# Altium footprint library Generic Footprint.PcbLib: 160 footprints (part 15 of 20) (continued)
## Symbol_FCC-Logo-3x2mm_Silkscreen [mm] (continued)
1(1.321,1.222) 1(1.321,1.243) 1(1.321,1.246) 1(1.321,1.249) 1(1.321,1.256) 1(1.321,1.26) 1(1.321,1.763) 1(1.321,1.766) 1(1.321,1.77) 1(1.324,0.331) 1(1.324,0.338) 1(1.324,0.342) 1(1.324,0.838) 1(1.324,0.865) 1(1.324,0.869) 1(1.324,0.872) 1(1.324,0.875) 1(1.324,1.226) 1(1.324,1.229) 1(1.324,1.232) 1(1.324,1.236) 1(1.324,1.239) 1(1.324,1.243) 1(1.324,1.253) 1(1.324,1.263) 1(1.324,1.266) 1(1.324,1.759) 1(1.324,1.766) 1(1.328,0.328) 1(1.328,0.335) 1(1.328,0.338) 1(1.328,0.824) 1(1.328,0.828) 1(1.328,0.831) 1(1.328,0.835) 1(1.328,0.838) 1(1.328,0.841) 1(1.328,0.845) 1(1.328,0.848) 1(1.328,0.852) 1(1.328,0.855) 1(1.328,0.858) 1(1.328,0.862) 1(1.328,1.246) 1(1.328,1.249) 1(1.328,1.253) 1(1.328,1.256) 1(1.328,1.26) 1(1.328,1.263) 1(1.328,1.27) 1(1.328,1.273) 1(1.328,1.277) 1(1.328,1.763) 1(1.328,1.766) 1(1.328,1.77) 1(1.328,1.773) 1(1.331,0.331) 1(1.331,0.335) 1(1.331,0.818) 1(1.331,0.821) 1(1.331,0.828) 1(1.331,0.831) 1(1.331,0.835) 1(1.331,0.841) 1(1.331,0.845) 1(1.331,0.848) 1(1.331,1.253) 1(1.331,1.256) 1(1.331,1.26) 1(1.331,1.263) 1(1.331,1.27) 1(1.331,1.273) 1(1.331,1.28) 1(1.331,1.283) 1(1.331,1.287) 1(1.331,1.77) 1(1.331,1.773) 1(1.331,1.776) 1(1.334,0.325) 1(1.334,0.328) 1(1.334,0.331) 1(1.334,0.807) 1(1.334,0.811) 1(1.334,0.818) 1(1.334,0.821) 1(1.334,0.828) 1(1.334,0.831) 1(1.334,0.835) 1(1.334,1.27) 1(1.334,1.273) 1(1.334,1.28) 1(1.334,1.283) 1(1.334,1.287) 1(1.334,1.29) 1(1.334,1.294) 1(1.334,1.297) 1(1.334,1.3) 1(1.334,1.773) 1(1.334,1.78) 1(1.338,0.318) 1(1.338,0.321) 1(1.338,0.325) 1(1.338,0.328) 1(1.338,0.807) 1(1.338,0.811) 1(1.338,0.814) 1(1.338,0.818) 1(1.338,0.821) 1(1.338,1.28) 1(1.338,1.283) 1(1.338,1.287) 1(1.338,1.294) 1(1.338,1.297) 1(1.338,1.3) 1(1.338,1.783) 1(1.341,0.314) 1(1.341,0.325) 1(1.341,0.804) 1(1.341,0.807) 1(1.341,1.297) 1(1.341,1.787) 1(1.345,0.311) 1(1.345,0.318) 1(1.345,0.78) 1(1.345,0.811) 1(1.345,1.294) 1(1.345,1.3) 1(1.345,1.324) 1(1.345,1.79) 1(1.348,0.314) 1(1.348,0.318) 1(1.348,0.767) 1(1.348,0.77) 1(1.348,0.773) 1(1.348,0.78) 1(1.348,0.79) 1(1.348,0.794) 1(1.348,0.797) 1(1.348,0.801) 1(1.348,1.304) 1(1.348,1.307) 1(1.348,1.311) 1(1.348,1.324) 1(1.348,1.331) 1(1.348,1.334) 1(1.348,1.338) 1(1.348,1.79) 1(1.348,1.793) 1(1.351,0.308) 1(1.351,0.311) 1(1.351,0.314) 1(1.351,0.76) 1(1.351,0.767) 1(1.351,0.77) 1(1.351,0.773) 1(1.351,0.78) 1(1.351,0.784) 1(1.351,0.787) 1(1.351,1.314) 1(1.351,1.317) 1(1.351,1.321) 1(1.351,1.324) 1(1.351,1.331) 1(1.351,1.334) 1(1.351,1.338) 1(1.351,1.341) 1(1.351,1.345) 1(1.351,1.79) 1(1.351,1.793) 1(1.351,1.797) 1(1.355,0.301) 1(1.355,0.304) 1(1.355,0.308) 1(1.355,0.311) 1(1.355,0.75) 1(1.355,0.753) 1(1.355,0.756) 1(1.355,0.76) 1(1.355,0.767) 1(1.355,0.773) 1(1.355,0.777) 1(1.355,1.328) 1(1.355,1.331) 1(1.355,1.338) 1(1.355,1.341) 1(1.355,1.345) 1(1.355,1.348) 1(1.355,1.351) 1(1.355,1.793) 1(1.355,1.797) 1(1.355,1.8) 1(1.355,1.804) 1(1.358,0.304) 1(1.358,0.76) 1(1.358,0.763) 1(1.358,0.77) 1(1.358,1.334) 1(1.358,1.341) 1(1.358,1.355) 1(1.358,1.797) 1(1.362,0.301) 1(1.362,0.304) 1(1.362,0.308) 1(1.362,0.739) 1(1.362,0.743) 1(1.362,0.746) 1(1.362,0.753) 1(1.362,1.345) 1(1.362,1.351) 1(1.362,1.358) 1(1.362,1.362) 1(1.362,1.365) 1(1.362,1.807) 1(1.365,0.297) 1(1.365,0.736) 1(1.365,0.743) 1(1.365,0.753) 1(1.365,1.351) 1(1.365,1.362) 1(1.365,1.365) 1(1.365,1.368) 1(1.365,1.372) 1(1.365,1.81) 1(1.368,0.294) 1(1.368,0.297) 1(1.368,0.301) 1(1.368,0.729) 1(1.368,0.736) 1(1.368,0.743) 1(1.368,1.362) 1(1.368,1.365) 1(1.368,1.368) 1(1.368,1.372) 1(1.368,1.375) 1(1.372,0.291) 1(1.372,0.294) 1(1.372,0.297) 1(1.372,0.729) 1(1.372,0.733) 1(1.372,0.736) 1(1.372,1.368) 1(1.372,1.372) 1(1.372,1.375) 1(1.372,1.814) 1(1.375,0.287) 1(1.375,0.291) 1(1.375,0.294) 1(1.375,0.712) 1(1.375,0.722) 1(1.375,0.726) 1(1.375,0.729) 1(1.375,1.375) 1(1.375,1.392) 1(1.375,1.817) 1(1.379,0.28) 1(1.379,0.284) 1(1.379,0.287) 1(1.379,0.712) 1(1.379,1.379) 1(1.379,1.382) 1(1.379,1.392) 1(1.379,1.399) 1(1.379,1.402) 1(1.379,1.814) 1(1.379,1.817) 1(1.379,1.821) 1(1.382,0.277) 1(1.382,0.284) 1(1.382,0.287) 1(1.382,0.291) 1(1.382,0.699) 1(1.382,0.702) 1(1.382,0.712) 1(1.382,0.716) 1(1.382,0.719) 1(1.382,1.385) 1(1.382,1.389) 1(1.382,1.392) 1(1.382,1.399) 1(1.382,1.406) 1(1.382,1.409) 1(1.382,1.814) 1(1.382,1.817) 1(1.382,1.821) 1(1.382,1.824) 1(1.385,0.28) 1(1.385,0.284) 1(1.385,0.692) 1(1.385,0.695) 1(1.385,0.699) 1(1.385,0.702) 1(1.385,0.705) 1(1.385,0.709) 1(1.385,1.396) 1(1.385,1.399) 1(1.385,1.402) 1(1.385,1.406) 1(1.385,1.409) 1(1.385,1.413) 1(1.385,1.821) 1(1.385,1.824) 1(1.385,1.827) 1(1.389,0.274) 1(1.389,0.277) 1(1.389,0.28) 1(1.389,0.682) 1(1.389,0.685) 1(1.389,0.688) 1(1.389,0.692) 1(1.389,0.695) 1(1.389,0.699) 1(1.389,1.402) 1(1.389,1.406) 1(1.389,1.409) 1(1.389,1.413) 1(1.389,1.416) 1(1.389,1.419) 1(1.389,1.824) 1(1.389,1.831) 1(1.392,0.695) 1(1.392,0.702) 1(1.392,1.413) 1(1.392,1.416) 1(1.392,1.423) 1(1.392,1.827) 1(1.392,1.834) 1(1.396,0.27) 1(1.396,0.277) 1(1.396,0.675) 1(1.396,0.678) 1(1.396,0.685) 1(1.396,0.692) 1(1.396,1.416) 1(1.396,1.419) 1(1.396,1.426) 1(1.396,1.43) 1(1.396,1.827) 1(1.396,1.838) 1(1.399,0.267) 1(1.399,0.27) 1(1.399,0.274) 1(1.399,0.675) 1(1.399,0.685) 1(1.399,1.419) 1(1.399,1.426) 1(1.399,1.43) 1(1.399,1.433) 1(1.399,1.436) 1(1.402,0.263) 1(1.402,0.267) 1(1.402,0.274) 1(1.402,0.665) 1(1.402,0.675) 1(1.402,1.426) 1(1.402,1.43) 1(1.402,1.433) 1(1.402,1.436) 1(1.402,1.841) 1(1.406,0.26) 1(1.406,0.263) 1(1.406,0.267) 1(1.406,0.27) 1(1.406,0.665) 1(1.406,0.671) 1(1.406,1.433) 1(1.406,1.436) 1(1.406,1.841) 1(1.406,1.844) 1(1.409,0.257) 1(1.409,0.26) 1(1.409,0.651) 1(1.409,0.654) 1(1.409,0.668) 1(1.409,1.844) 1(1.409,1.848) 1(1.413,0.253) 1(1.413,0.263) 1(1.413,0.648) 1(1.413,0.654) 1(1.413,0.661) 1(1.413,0.665) 1(1.413,1.44) 1(1.413,1.443) 1(1.413,1.45) 1(1.413,1.453) 1(1.413,1.457) 1(1.413,1.841) 1(1.416,0.26) 1(1.416,0.641) 1(1.416,0.644) 1(1.416,0.648) 1(1.416,0.651) 1(1.416,0.654) 1(1.416,0.658) 1(1.416,1.447) 1(1.416,1.453) 1(1.416,1.457) 1(1.416,1.46) 1(1.416,1.464) 1(1.416,1.467) 1(1.419,0.246) 1(1.419,0.25) 1(1.419,0.253) 1(1.419,0.257) 1(1.419,0.634) 1(1.419,0.637) 1(1.419,0.641) 1(1.419,0.648) 1(1.419,0.651) 1(1.419,1.453) 1(1.419,1.457) 1(1.419,1.46) 1(1.419,1.464) 1(1.419,1.47) 1(1.419,1.844) 1(1.419,1.848) 1(1.419,1.855) 1(1.423,0.25) 1(1.423,0.253) 1(1.423,0.257) 1(1.423,0.631) 1(1.423,0.637) 1(1.423,0.641) 1(1.423,1.46) 1(1.423,1.464) 1(1.423,1.47) 1(1.423,1.474) 1(1.423,1.848) 1(1.423,1.851) 1(1.423,1.855) 1(1.423,1.858) 1(1.426,0.243) 1(1.426,0.246) 1(1.426,1.858) 1(1.426,1.861) 1(1.43,0.25) 1(1.43,0.631) 1(1.43,0.637) 1(1.43,1.47) 1(1.43,1.474) 1(1.43,1.855) 1(1.43,1.865) 1(1.433,0.24) 1(1.433,0.246) 1(1.433,0.631) 1(1.433,1.005) 1(1.433,1.008) 1(1.433,1.011) 1(1.433,1.015) 1(1.433,1.018) 1(1.433,1.022) 1(1.433,1.025) 1(1.433,1.028) 1(1.433,1.032) 1(1.433,1.035) 1(1.433,1.039) 1(1.433,1.042) 1(1.433,1.045) 1(1.433,1.049) 1(1.433,1.052) 1(1.433,1.056) 1(1.433,1.059) 1(1.433,1.062) 1(1.433,1.066) 1(1.433,1.069) 1(1.433,1.073) 1(1.433,1.076) 1(1.433,1.079) 1(1.433,1.083) 1(1.433,1.086) 1(1.433,1.09) 1(1.433,1.093) 1(1.433,1.096) 1(1.433,1.1) 1(1.433,1.474) 1(1.433,1.477) 1(1.433,1.481) 1(1.433,1.487) 1(1.433,1.858) 1(1.433,1.861) 1(1.436,0.236) 1(1.436,0.24) 1(1.436,0.243) 1(1.436,0.614) 1(1.436,0.62) 1(1.436,0.624) 1(1.436,0.627) 1(1.436,0.971) 1(1.436,0.974) 1(1.436,0.977) 1(1.436,0.981) 1(1.436,0.984) 1(1.436,0.988) 1(1.436,0.991) 1(1.436,0.994) 1(1.436,1.005) 1(1.436,1.008) 1(1.436,1.011) 1(1.436,1.015) 1(1.436,1.018) 1(1.436,1.022) 1(1.436,1.025) 1(1.436,1.028) 1(1.436,1.032) 1(1.436,1.035) 1(1.436,1.039) 1(1.436,1.042) 1(1.436,1.045) 1(1.436,1.049) 1(1.436,1.052) 1(1.436,1.056) 1(1.436,1.059) 1(1.436,1.062) 1(1.436,1.066) 1(1.436,1.069) 1(1.436,1.073) 1(1.436,1.076) 1(1.436,1.079) 1(1.436,1.083) 1(1.436,1.086) 1(1.436,1.09) 1(1.436,1.093) 1(1.436,1.096) 1(1.436,1.1) 1(1.436,1.11) 1(1.436,1.113) 1(1.436,1.117) 1(1.436,1.12) 1(1.436,1.124) 1(1.436,1.127) 1(1.436,1.13) 1(1.436,1.134) 1(1.436,1.487) 1(1.436,1.491) 1(1.436,1.861) 1(1.436,1.868) 1(1.44,0.229) 1(1.44,0.233) 1(1.44,0.236) 1(1.44,0.243) 1(1.44,0.614) 1(1.44,0.947) 1(1.44,0.95) 1(1.44,0.954) 1(1.44,0.957) 1(1.44,0.96) 1(1.44,0.971) 1(1.44,0.974) 1(1.44,0.977) 1(1.44,0.981) 1(1.44,0.984) 1(1.44,0.988) 1(1.44,0.991) 1(1.44,0.994) 1(1.44,1.001) 1(1.44,1.005) 1(1.44,1.008) 1(1.44,1.011) 1(1.44,1.015) 1(1.44,1.018) 1(1.44,1.022) 1(1.44,1.025) 1(1.44,1.028) 1(1.44,1.032) 1(1.44,1.035) 1(1.44,1.039) 1(1.44,1.042) 1(1.44,1.045) 1(1.44,1.049) 1(1.44,1.052) 1(1.44,1.056) 1(1.44,1.059) 1(1.44,1.062) 1(1.44,1.066) 1(1.44,1.069) 1(1.44,1.073) 1(1.44,1.076) 1(1.44,1.079) 1(1.44,1.083) 1(1.44,1.086) 1(1.44,1.09) 1(1.44,1.093) 1(1.44,1.096) 1(1.44,1.1) 1(1.44,1.103) 1(1.44,1.11) 1(1.44,1.113) 1(1.44,1.117) 1(1.44,1.12) 1(1.44,1.124) 1(1.44,1.127) 1(1.44,1.13) 1(1.44,1.134) 1(1.44,1.141) 1(1.44,1.144) 1(1.44,1.147) 1(1.44,1.151) 1(1.44,1.154) 1(1.44,1.158) 1(1.44,1.484) 1(1.44,1.491) 1(1.44,1.498) 1(1.44,1.872) 1(1.443,0.24) 1(1.443,0.607) 1(1.443,0.61) 1(1.443,0.614) 1(1.443,0.617) 1(1.443,0.926) 1(1.443,0.93) 1(1.443,0.933) 1(1.443,0.937) 1(1.443,0.94) 1(1.443,0.943) 1(1.443,0.947) 1(1.443,0.964) 1(1.443,0.998) 1(1.443,1.158) 1(1.443,1.161) 1(1.443,1.164) 1(1.443,1.168) 1(1.443,1.171) 1(1.443,1.175) 1(1.443,1.487) 1(1.443,1.491) 1(1.443,1.501) 1(1.443,1.872) 1(1.443,1.875) 1(1.447,0.236) 1(1.447,0.597) 1(1.447,0.6) 1(1.447,0.909) 1(1.447,0.913) 1(1.447,0.916) 1(1.447,0.92) 1(1.447,0.923) 1(1.447,0.95) 1(1.447,0.954) 1(1.447,0.957) 1(1.447,0.96) 1(1.447,0.964) 1(1.447,0.967) 1(1.447,0.971) 1(1.447,0.974) 1(1.447,0.977) 1(1.447,0.981) 1(1.447,0.984) 1(1.447,0.988) 1(1.447,0.991) 1(1.447,0.994) 1(1.447,1.107) 1(1.447,1.11) 1(1.447,1.113) 1(1.447,1.117) 1(1.447,1.12) 1(1.447,1.124) 1(1.447,1.127) 1(1.447,1.13) 1(1.447,1.134) 1(1.447,1.137) 1(1.447,1.141) 1(1.447,1.144) 1(1.447,1.147) 1(1.447,1.151) 1(1.447,1.154) 1(1.447,1.178) 1(1.447,1.181) 1(1.447,1.185) 1(1.447,1.188) 1(1.447,1.192) 1(1.447,1.195) 1(1.447,1.494) 1(1.447,1.498) 1(1.447,1.501) 1(1.447,1.504) 1(1.447,1.508) 1(1.447,1.878) 1(1.45,0.226) 1(1.45,0.593) 1(1.45,0.597) 1(1.45,0.6) 1(1.45,0.603) 1(1.45,0.896) 1(1.45,0.899) 1(1.45,0.903) 1(1.45,0.906) 1(1.45,0.93) 1(1.45,0.937) 1(1.45,0.947) 1(1.45,0.95) 1(1.45,0.954) 1(1.45,0.957) 1(1.45,0.96) 1(1.45,0.964) 1(1.45,1.141) 1(1.45,1.144) 1(1.45,1.147) 1(1.45,1.151) 1(1.45,1.154) 1(1.45,1.158) 1(1.45,1.168) 1(1.45,1.175) 1(1.45,1.198) 1(1.45,1.202) 1(1.45,1.205) 1(1.45,1.209) 1(1.45,1.498) 1(1.45,1.501) 1(1.45,1.508) 1(1.45,1.511) 1(1.453,0.223) 1(1.453,0.586) 1(1.453,0.59) 1(1.453,0.597) 1(1.453,0.6) 1(1.453,0.886) 1(1.453,0.889) 1(1.453,0.892) 1(1.453,0.896) 1(1.453,0.899) 1(1.453,0.93) 1(1.453,0.937) 1(1.453,1.168) 1(1.453,1.175) 1(1.453,1.202) 1(1.453,1.209) 1(1.453,1.212) 1(1.453,1.215) 1(1.453,1.219) 1(1.453,1.511) 1(1.453,1.515) 1(1.453,1.872) 1(1.453,1.875) 1(1.453,1.882) 1(1.457,0.219) 1(1.457,0.226) 1(1.457,0.59) 1(1.457,0.872) 1(1.457,0.886) 1(1.457,0.896) 1(1.457,0.899) 1(1.457,1.202) 1(1.457,1.209) 1(1.457,1.212) 1(1.457,1.215) 1(1.457,1.219) 1(1.457,1.222) 1(1.457,1.232) 1(1.457,1.508) 1(1.457,1.515) 1(1.457,1.518) 1(1.457,1.875) 1(1.457,1.878) 1(1.457,1.885) 1(1.46,0.583) 1(1.46,0.586) 1(1.46,0.59) 1(1.46,0.869) 1(1.46,0.875) 1(1.46,0.879) 1(1.46,1.222) 1(1.46,1.226) 1(1.46,1.229) 1(1.46,1.511) 1(1.46,1.518) 1(1.46,1.878) 1(1.46,1.882) 1(1.46,1.889) 1(1.464,0.216) 1(1.464,0.226) 1(1.464,0.583) 1(1.464,0.586) 1(1.464,0.858) 1(1.464,0.862) 1(1.464,0.865) 1(1.464,0.869) 1(1.464,0.872) 1(1.464,0.875) 1(1.464,0.879) 1(1.464,0.882) 1(1.464,0.886) 1(1.464,1.212) 1(1.464,1.215) 1(1.464,1.219) 1(1.464,1.222) 1(1.464,1.226) 1(1.464,1.229) 1(1.464,1.232) 1(1.464,1.239) 1(1.464,1.243) 1(1.464,1.246) 1(1.464,1.515) 1(1.467,0.212) 1(1.467,0.216) 1(1.467,0.219) 1(1.467,0.569) 1(1.467,0.573) 1(1.467,0.583) 1(1.467,0.841) 1(1.467,0.845) 1(1.467,0.848) 1(1.467,0.852) 1(1.467,0.858) 1(1.467,0.862) 1(1.467,0.869) 1(1.467,0.872) 1(1.467,0.875) 1(1.467,0.879) 1(1.467,1.226) 1(1.467,1.229) 1(1.467,1.232) 1(1.467,1.236) 1(1.467,1.239) 1(1.467,1.243) 1(1.467,1.246) 1(1.467,1.253) 1(1.467,1.256) 1(1.467,1.26) 1(1.467,1.518) 1(1.467,1.521) 1(1.467,1.532) 1(1.467,1.882) 1(1.467,1.892) 1(1.47,0.566) 1(1.47,0.573) 1(1.47,0.576) 1(1.47,0.58) 1(1.47,0.828) 1(1.47,0.838) 1(1.47,0.841) 1(1.47,0.845) 1(1.47,0.848) 1(1.47,0.852) 1(1.47,0.858) 1(1.47,0.862) 1(1.47,1.239) 1(1.47,1.243) 1(1.47,1.246) 1(1.47,1.253) 1(1.47,1.256) 1(1.47,1.26) 1(1.47,1.263) 1(1.47,1.266) 1(1.47,1.273) 1(1.47,1.277) 1(1.47,1.525) 1(1.47,1.532) 1(1.47,1.535) 1(1.47,1.538) 1(1.47,1.895) 1(1.474,0.209) 1(1.474,0.212) 1(1.474,0.216) 1(1.474,0.219) 1(1.474,0.563) 1(1.474,0.569) 1(1.474,0.573) 1(1.474,0.818) 1(1.474,0.831) 1(1.474,0.835) 1(1.474,0.838) 1(1.474,0.845) 1(1.474,0.848) 1(1.474,0.852) 1(1.474,0.855) 1(1.474,1.249) 1(1.474,1.253) 1(1.474,1.256) 1(1.474,1.26) 1(1.474,1.263) 1(1.474,1.266) 1(1.474,1.528) 1(1.474,1.535) 1(1.474,1.892) 1(1.477,0.206) 1(1.477,0.559) 1(1.477,0.566) 1(1.477,0.821) 1(1.477,0.824) 1(1.477,1.28) 1(1.477,1.283) 1(1.477,1.287) 1(1.477,1.532) 1(1.477,1.538) 1(1.477,1.542) 1(1.477,1.545) 1(1.477,1.899) 1(1.481,0.202) 1(1.481,0.209) 1(1.481,0.212) 1(1.481,0.556) 1(1.481,0.559) 1(1.481,0.563) 1(1.481,0.566) 1(1.481,0.569) 1(1.481,0.807) 1(1.481,0.811) 1(1.481,0.814) 1(1.481,0.838) 1(1.481,0.841) 1(1.481,1.263) 1(1.481,1.266) 1(1.481,1.27) 1(1.481,1.29) 1(1.481,1.294) 1(1.481,1.535) 1(1.481,1.538) 1(1.481,1.545) 1(1.481,1.892) 1(1.484,0.199) 1(1.484,0.206) 1(1.484,0.209) 1(1.484,0.549) 1(1.484,0.559) 1(1.484,0.563) 1(1.484,0.804) 1(1.484,0.811) 1(1.484,1.294) 1(1.484,1.297) 1(1.484,1.3) 1(1.484,1.545) 1(1.484,1.552) 1(1.484,1.555) 1(1.484,1.902) 1(1.487,0.206) 1(1.487,0.546) 1(1.487,0.79) 1(1.487,0.794) 1(1.487,0.797) 1(1.487,0.804) 1(1.487,0.811) 1(1.487,1.294) 1(1.487,1.3) 1(1.487,1.307) 1(1.487,1.311) 1(1.487,1.314) 1(1.487,1.549) 1(1.487,1.552) 1(1.491,0.195) 1(1.491,0.549) 1(1.491,0.552) 1(1.491,0.784) 1(1.491,0.79) 1(1.491,0.794) 1(1.491,0.797) 1(1.491,0.801) 1(1.491,0.804) 1(1.491,1.3) 1(1.491,1.304) 1(1.491,1.307) 1(1.491,1.311) 1(1.491,1.314) 1(1.491,1.317) 1(1.491,1.555) 1(1.491,1.902) 1(1.491,1.906) 1(1.491,1.909) 1(1.494,0.192) 1(1.494,0.546) 1(1.494,0.787) 1(1.494,0.797) 1(1.494,1.314) 1(1.494,1.552) 1(1.494,1.906) 1(1.498,0.539) 1(1.498,0.549) 1(1.498,0.77) 1(1.498,0.777) 1(1.498,0.784) 1(1.498,0.787) 1(1.498,0.79) 1(1.498,0.794) 1(1.498,1.307) 1(1.498,1.311) 1(1.498,1.317) 1(1.498,1.324) 1(1.498,1.328) 1(1.498,1.334) 1(1.498,1.555) 1(1.498,1.566) 1(1.498,1.902) 1(1.498,1.909) 1(1.498,1.912) 1(1.501,0.195) 1(1.501,0.532) 1(1.501,0.535) 1(1.501,0.539) 1(1.501,0.542) 1(1.501,0.546) 1(1.501,0.76) 1(1.501,0.763) 1(1.501,0.767) 1(1.501,0.777) 1(1.501,0.78) 1(1.501,0.784) 1(1.501,0.787) 1(1.501,1.317) 1(1.501,1.321) 1(1.501,1.328) 1(1.501,1.338) 1(1.501,1.341) 1(1.501,1.559) 1(1.501,1.562) 1(1.501,1.566) 1(1.501,1.569) 1(1.501,1.906) 1(1.504,0.189) 1(1.504,0.529) 1(1.504,0.535) 1(1.504,0.539) 1(1.504,0.756) 1(1.504,0.767) 1(1.504,0.77) 1(1.504,0.777) 1(1.504,1.328) 1(1.504,1.334) 1(1.504,1.338) 1(1.504,1.345) 1(1.504,1.348) 1(1.504,1.569) 1(1.504,1.572) 1(1.504,1.576) 1(1.504,1.909) 1(1.504,1.912) 1(1.504,1.916) 1(1.508,0.192) 1(1.508,0.195) 1(1.508,0.525) 1(1.508,0.532) 1(1.508,0.535) 1(1.508,0.753) 1(1.508,0.76) 1(1.508,0.767) 1(1.508,0.77) 1(1.508,0.773) 1(1.508,1.331) 1(1.508,1.334) 1(1.508,1.338) 1(1.508,1.351) 1(1.508,1.566) 1(1.508,1.572) 1(1.511,0.185) 1(1.511,0.189) 1(1.511,0.192) 1(1.511,0.522) 1(1.511,0.529) 1(1.511,0.532) 1(1.511,0.75) 1(1.511,0.76) 1(1.511,1.348) 1(1.511,1.569) 1(1.511,1.576) 1(1.511,1.579) 1(1.511,1.912) 1(1.511,1.916) 1(1.511,1.919) 1(1.515,0.182) 1(1.515,0.518) 1(1.515,0.525) 1(1.515,0.529) 1(1.515,0.743) 1(1.515,0.746) 1(1.515,0.75) 1(1.515,0.753) 1(1.515,1.348) 1(1.515,1.355) 1(1.515,1.358) 1(1.515,1.362) 1(1.515,1.572) 1(1.515,1.579) 1(1.515,1.583) 1(1.515,1.916) 1(1.515,1.923) 1(1.518,0.189) 1(1.518,0.515) 1(1.518,0.518) 1(1.518,0.522) 1(1.518,0.525) 1(1.518,0.736) 1(1.518,0.743) 1(1.518,0.75) 1(1.518,0.753) 1(1.518,1.358) 1(1.518,1.362) 1(1.518,1.368) 1(1.518,1.576) 1(1.518,1.579) 1(1.518,1.583) 1(1.518,1.926) 1(1.521,0.175) 1(1.521,0.178) 1(1.521,0.182) 1(1.521,0.522) 1(1.521,0.736) 1(1.521,0.739) 1(1.521,0.743) 1(1.521,1.358) 1(1.521,1.362) 1(1.521,1.368) 1(1.521,1.375) 1(1.521,1.379) 1(1.521,1.583) 1(1.525,0.178) 1(1.525,0.182) 1(1.525,0.515) 1(1.525,0.518) 1(1.525,0.726) 1(1.525,0.736) 1(1.525,1.365) 1(1.525,1.368) 1(1.525,1.375) 1(1.525,1.593) 1(1.525,1.929) 1(1.528,0.172) 1(1.528,0.508) 1(1.528,0.716) 1(1.528,0.719) 1(1.528,0.733) 1(1.528,1.372) 1(1.528,1.379) 1(1.528,1.385) 1(1.528,1.389) 1(1.528,1.586) 1(1.528,1.593) 1(1.528,1.596) 1(1.532,0.175) 1(1.532,0.178) 1(1.532,0.501) 1(1.532,0.505) 1(1.532,0.508) 1(1.532,0.515) 1(1.532,0.719) 1(1.532,0.726) 1(1.532,0.729) 1(1.532,1.375) 1(1.532,1.379) 1(1.532,1.382) 1(1.532,1.589) 1(1.532,1.6) 1(1.532,1.933) 1(1.535,0.175) 1(1.535,0.498) 1(1.535,0.505) 1(1.535,0.508) 1(1.535,0.512) 1(1.535,0.705) 1(1.535,0.709) 1(1.535,0.716) 1(1.535,0.722) 1(1.535,0.726) 1(1.535,1.385) 1(1.535,1.389) 1(1.535,1.392) 1(1.535,1.396) 1(1.535,1.399) 1(1.535,1.593) 1(1.535,1.596) 1(1.535,1.6) 1(1.535,1.603) 1(1.535,1.929) 1(1.535,1.936) 1(1.538,0.165) 1(1.538,0.168) 1(1.538,0.495) 1(1.538,0.501) 1(1.538,0.505) 1(1.538,0.702) 1(1.538,0.712) 1(1.538,0.716) 1(1.538,0.719) 1(1.538,1.385) 1(1.538,1.389) 1(1.538,1.402) 1(1.538,1.596) 1(1.538,1.6) 1(1.538,1.603) 1(1.538,1.606) 1(1.538,1.61) 1(1.538,1.929) 1(1.542,0.491) 1(1.542,0.498) 1(1.542,0.501) 1(1.542,0.695) 1(1.542,0.699) 1(1.542,1.406) 1(1.542,1.606) 1(1.542,1.933) 1(1.542,1.936) 1(1.542,1.94) 1(1.545,0.161) 1(1.545,0.495) 1(1.545,0.498) 1(1.545,0.692) 1(1.545,1.409) 1(1.545,1.413) 1(1.545,1.603) 1(1.545,1.61) 1(1.545,1.613) 1(1.549,0.491) 1(1.549,0.495) 1(1.549,0.688) 1(1.549,0.695) 1(1.549,0.699) 1(1.549,1.406) 1(1.549,1.409) 1(1.549,1.416) 1(1.549,1.606) 1(1.549,1.613) 1(1.549,1.933) 1(1.549,1.94) 1(1.549,1.943) 1(1.552,0.158) 1(1.552,0.165) 1(1.552,0.481) 1(1.552,0.484) 1(1.552,0.491) 1(1.552,0.692) 1(1.552,0.695) 1(1.552,0.699) 1(1.552,1.406) 1(1.552,1.409) 1(1.552,1.413) 1(1.552,1.61) 1(1.552,1.613) 1(1.552,1.936) 1(1.555,0.161) 1(1.555,0.165) 1(1.555,0.481) 1(1.555,0.484) 1(1.555,0.488) 1(1.555,0.675) 1(1.555,0.678) 1(1.555,0.688) 1(1.555,0.692) 1(1.555,1.413) 1(1.555,1.416) 1(1.555,1.423) 1(1.555,1.426) 1(1.555,1.617) 1(1.555,1.623) 1(1.555,1.94) 1(1.555,1.946) 1(1.559,0.484) 1(1.559,0.671) 1(1.559,0.678) 1(1.559,0.685) 1(1.559,0.688) 1(1.559,1.416) 1(1.559,1.419) 1(1.559,1.423) 1(1.559,1.426) 1(1.559,1.43) 1(1.559,1.623) 1(1.559,1.627) 1(1.559,1.95) 1(1.562,0.155) 1(1.562,0.158) 1(1.562,0.161) 1(1.562,0.682) 1(1.562,1.423) 1(1.562,1.433) 1(1.562,1.62) 1(1.562,1.627) 1(1.562,1.946) 1(1.566,0.471) 1(1.566,0.474) 1(1.566,0.481) 1(1.566,0.665) 1(1.566,0.668) 1(1.566,0.678) 1(1.566,1.426) 1(1.566,1.436) 1(1.566,1.44) 1(1.566,1.623) 1(1.566,1.953) 1(1.569,0.467) 1(1.569,0.474) 1(1.569,0.661) 1(1.569,0.668) 1(1.569,1.436) 1(1.569,1.443) 1(1.569,1.627) 1(1.569,1.634) 1(1.569,1.637) 1(1.569,1.946) 1(1.569,1.95) 1(1.569,1.957) 1(1.572,0.148) 1(1.572,0.151) 1(1.572,0.155) 1(1.572,0.158) 1(1.572,0.464) 1(1.572,0.471) 1(1.572,0.474) 1(1.572,0.478) 1(1.572,0.658) 1(1.572,0.661) 1(1.572,0.665) 1(1.572,0.668) 1(1.572,1.436) 1(1.572,1.44) 1(1.572,1.443) 1(1.572,1.447) 1(1.572,1.63) 1(1.572,1.634) 1(1.572,1.95) 1(1.576,0.144) 1(1.576,0.148) 1(1.576,0.151) 1(1.576,0.155) 1(1.576,0.461) 1(1.576,0.467) 1(1.576,0.471) 1(1.576,0.654) 1(1.576,0.658) 1(1.576,0.665) 1(1.576,1.44) 1(1.576,1.443) 1(1.576,1.447) 1(1.576,1.45) 1(1.576,1.634) 1(1.576,1.637) 1(1.576,1.64) 1(1.576,1.96) 1(1.579,0.148) 1(1.579,0.151) 1(1.579,0.464) 1(1.579,0.467) 1(1.579,0.651) 1(1.579,0.654) 1(1.579,0.661) 1(1.579,1.64) 1(1.579,1.644) 1(1.583,0.141) 1(1.583,0.461) 1(1.583,0.464) 1(1.583,0.651) 1(1.583,0.658) 1(1.583,1.447) 1(1.583,1.45) 1(1.583,1.457) 1(1.583,1.46) 1(1.583,1.637) 1(1.583,1.644) 1(1.586,0.454) 1(1.586,0.457) 1(1.586,0.637) 1(1.586,0.641) 1(1.586,0.644) 1(1.586,0.654) 1(1.586,1.45) 1(1.586,1.457) 1(1.586,1.46) 